# Altium footprint library Cyberdeck.PcbLib: 261 footprints (part 2 of 17)
Each footprint in its own frame and in the unit in brackets; x right, y up, seen from the top. Pads: shape width x height; smd on the part's side, far side on the other; paste and mask are expansions set on the pad; w line width, h text height; cw(c..) or ccw(c..) is an arc to the next point about the centre after c.
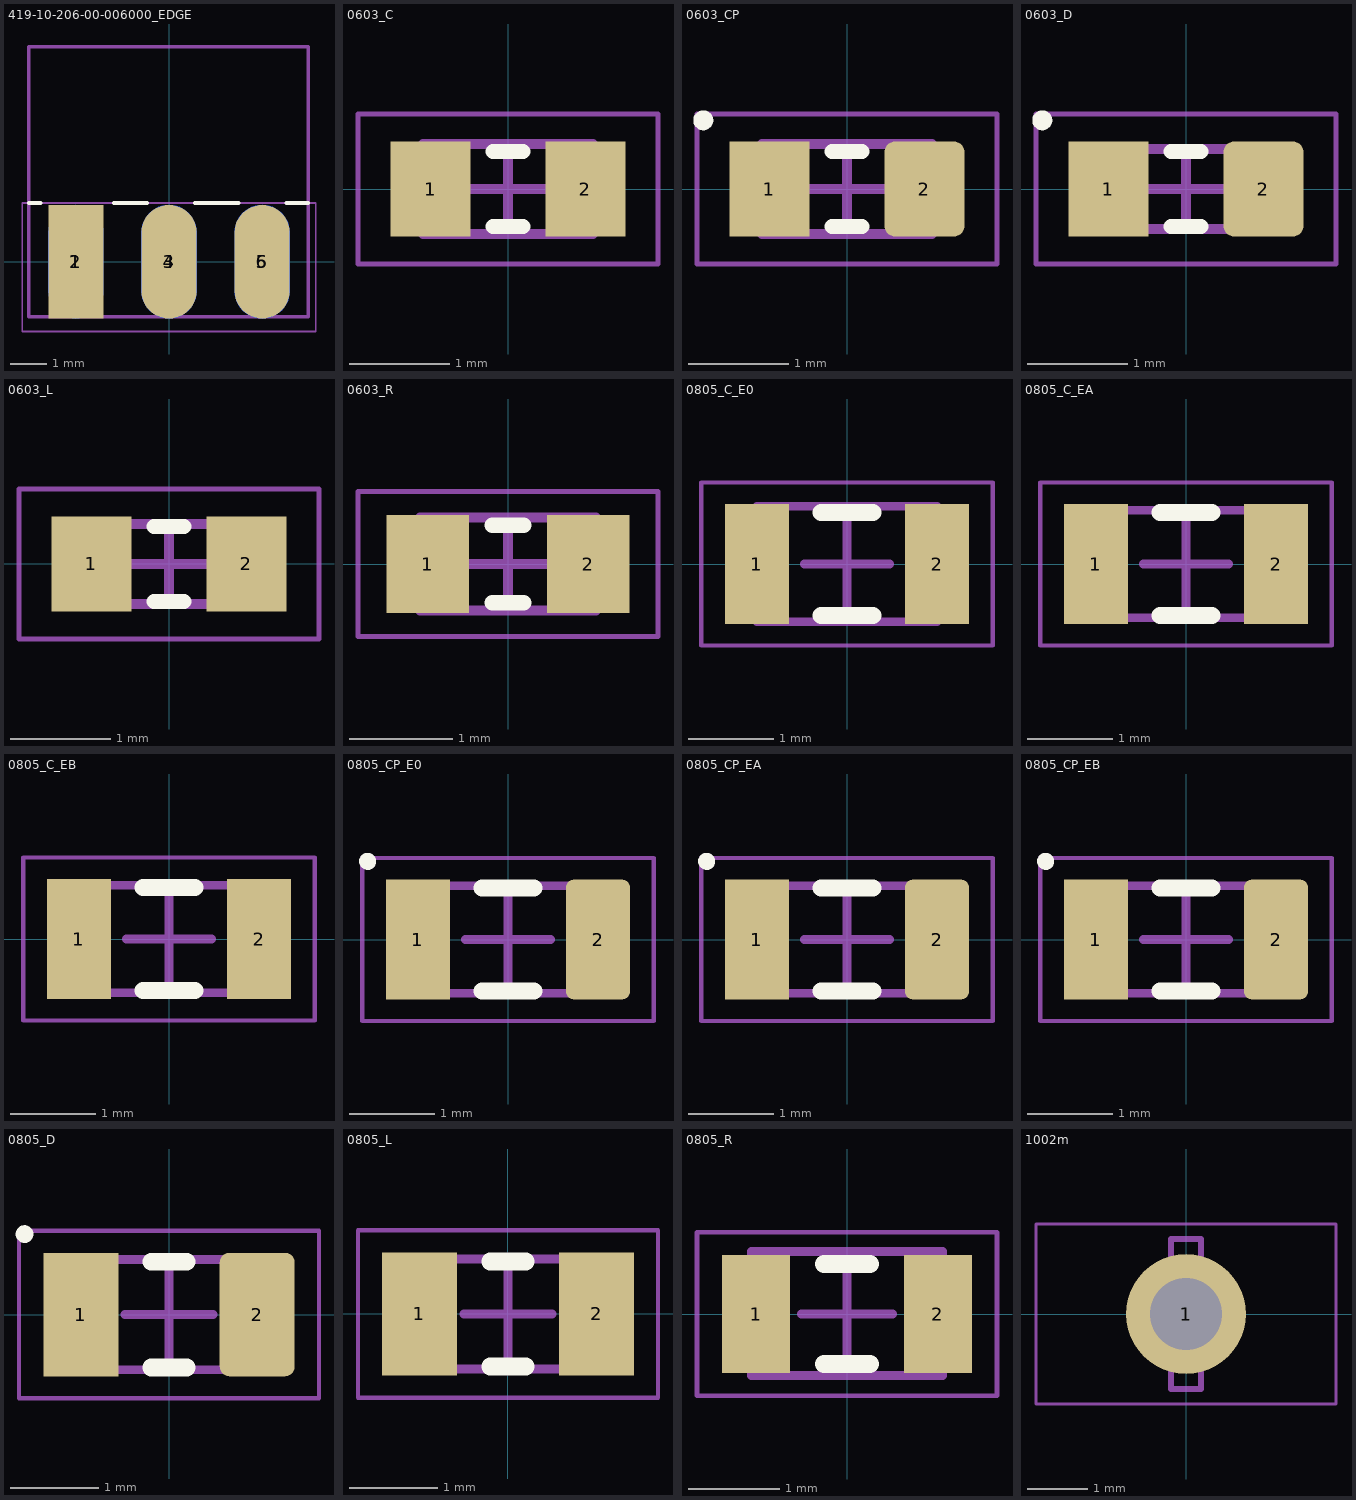
[diagram p1: the footprints below, top view; thin cyan lines are the x and y axes]

## 419-10-206-00-006000_EDGE [mm] "419-10-206-00-006000_EDGE"
height 2.6
pads (6):
  rect 1.5x3.1 smd: 1(-2.54,0)
  oval 1.5x3.1 smd far side: 2(-2.54,0) 4(0,0) 6(2.54,0)
  oval 1.5x3.1 smd: 3(0,0) 5(2.54,0)
Top Overlay:
  lines w0.1: -3.825,1.6 -3.5,1.6 ; -1.5,1.6 -0.6,1.6 ; 0.7,1.6 1.9,1.6 ; 3.2,1.6 3.8,1.6
Assembly Top:
  lines w0.1: -3.825,-1.5 -3.825,5.866 3.795,5.866 3.795,-1.5 -3.825,-1.5
Courtyard Top:
  lines w0.05: -4,-1.9 4,-1.9 4,1.6 -4,1.6 -4,-1.9
  lines w0.1: -0.5,0 0.5,0 ; 0,-0.5 0,0.5
3D body "mill-max-419-10-206-00-006000.STEP": height 1.52, standoff -3.56, extent -3.825,-1.5 3.795,5.866

## 0603_C [mm] "0603_C"
height 0.8
pads (2):
  rect 0.8x0.95 smd: 1(-0.775,0) 2(0.775,0)
Top Overlay:
  lines w0.15: -0.15,-0.375 0.15,-0.375 ; -0.15,0.375 0.15,0.375
Assembly Top:
  lines w0.1: -0.85,-0.45 -0.85,0.45 0.85,0.45 0.85,-0.45 -0.85,-0.45
Courtyard Top:
  lines w0.05: -1.5,-0.75 1.5,-0.75 1.5,0.75 -1.5,0.75 -1.5,-0.75
  lines w0.1: -0.4,0 0.4,0 ; 0,-0.4 0,0.4
3D body "CAPC-0603-T0.9-BN.stp": height 0.9, standoff 0, extent -0.85,-0.45 0.85,0.45

## 0603_CP [mm] "0603_CP"
height 0.8
pads (2):
  rect 0.8x0.95 smd: 1(-0.775,0)
  rrect25% 0.8x0.95 smd: 2(0.775,0)
Top Overlay:
  circle w0.1: c-1.437,0.687 r0.05
  lines w0.15: -0.15,-0.375 0.15,-0.375 ; -0.15,0.375 0.15,0.375
Assembly Top:
  lines w0.1: -0.85,-0.45 -0.85,0.45 0.85,0.45 0.85,-0.45 -0.85,-0.45
Courtyard Top:
  lines w0.05: -1.5,-0.75 1.5,-0.75 1.5,0.75 -1.5,0.75 -1.5,-0.75
  lines w0.1: -0.4,0 0.4,0 ; 0,-0.4 0,0.4
3D body "CAPC-0603-T0.9-BN.stp": height 0.9, standoff 0, extent -0.85,-0.45 0.85,0.45

## 0603_D [mm] "0603_D"
height 0.45
pads (2):
  rect 0.8x0.95 smd: 1(-0.775,0)
  rrect25% 0.8x0.95 smd: 2(0.775,0)
Top Overlay:
  circle w0.1: c-1.437,0.687 r0.05
  lines w0.15: -0.15,-0.375 0.15,-0.375 ; -0.15,0.375 0.15,0.375
Assembly Top:
  lines w0.1: -0.8,-0.4 -0.8,0.4 0.8,0.4 0.8,-0.4 -0.8,-0.4
Courtyard Top:
  lines w0.05: -1.5,-0.75 -1.5,0.75 1.5,0.75 1.5,-0.75 -1.5,-0.75
  lines w0.1: -0.4,0 0.4,0 ; 0,-0.4 0,0.4
3D body: height 0.45, standoff 0, extent -0.55,-0.4 0.55,0.4
3D body: height 0.45, standoff 0, extent -0.8,-0.4 -0.55,0.4
3D body: height 0.45, standoff 0, extent 0.55,-0.4 0.8,0.4

## 0603_L [mm] "0603_L"
height 0.45
pads (2):
  rect 0.8x0.95 smd: 1(-0.775,0) 2(0.775,0)
Top Overlay:
  lines w0.15: -0.15,-0.375 0.15,-0.375 ; -0.15,0.375 0.15,0.375
Assembly Top:
  lines w0.1: -0.8,-0.4 -0.8,0.4 0.8,0.4 0.8,-0.4 -0.8,-0.4
Courtyard Top:
  lines w0.05: -1.5,-0.75 -1.5,0.75 1.5,0.75 1.5,-0.75 -1.5,-0.75
  lines w0.1: -0.4,0 0.4,0 ; 0,-0.4 0,0.4
3D body: height 0.45, standoff 0, extent -0.55,-0.4 0.55,0.4
3D body: height 0.45, standoff 0, extent -0.8,-0.4 -0.55,0.4
3D body: height 0.45, standoff 0, extent 0.55,-0.4 0.8,0.4

## 0603_R [mm] "0603_R"
height 0.45
pads (2):
  rect 0.8x0.95 smd: 1(-0.775,0) 2(0.775,0)
Top Overlay:
  lines w0.15: -0.15,-0.375 0.15,-0.375 ; -0.15,0.375 0.15,0.375
Assembly Top:
  lines w0.1: -0.85,-0.45 -0.85,0.45 0.85,0.45 0.85,-0.45 -0.85,-0.45
Courtyard Top:
  lines w0.05: -1.45,-0.7 -1.45,0.7 1.45,0.7 1.45,-0.7 -1.45,-0.7
  lines w0.1: -0.4,0 0.4,0 ; 0,-0.4 0,0.4
3D body "RESC-0603.stp": height 0.55, standoff 0, extent -0.85,-0.45 0.85,0.45

## 0805_C_E0 [mm] "0805_C_E0"
height 0.6
pads (2):
  rect 0.75x1.4 smd: 1(-1.05,0) 2(1.05,0)
Top Overlay:
  lines w0.2: -0.3,-0.6 0.3,-0.6 ; -0.3,0.6 0.3,0.6
Assembly Top:
  lines w0.1: -1.05,-0.675 1.05,-0.675 1.05,0.675 -1.05,0.675 -1.05,-0.675
Courtyard Top:
  lines w0.05: -1.7,-0.95 1.7,-0.95 1.7,0.95 -1.7,0.95 -1.7,-0.95
  lines w0.1: -0.5,0 0.5,0 ; 0,-0.5 0,0.5
3D body "CAPC-0805-T1.35-BN.stp": height 1.35, standoff 0, extent -1.05,-0.675 1.05,0.675

## 0805_C_EA [mm] "0805_C_EA"
height 0.85
pads (2):
  rect 0.75x1.4 smd: 1(-1.05,0) 2(1.05,0)
Top Overlay:
  lines w0.2: -0.3,-0.6 0.3,-0.6 ; -0.3,0.6 0.3,0.6
Assembly Top:
  lines w0.1: -1,-0.625 1,-0.625 1,0.625 -1,0.625 -1,-0.625
Courtyard Top:
  lines w0.05: -1.7,-0.95 1.7,-0.95 1.7,0.95 -1.7,0.95 -1.7,-0.95
  lines w0.1: -0.5,0 0.5,0 ; 0,-0.5 0,0.5
3D body: height 0.85, standoff 0, extent -0.75,-0.625 0.75,0.625
3D body: height 0.85, standoff 0, extent -1,-0.625 -0.75,0.625
3D body: height 0.85, standoff 0, extent 0.75,-0.625 1,0.625

## 0805_C_EB [mm] "0805_C_EB"
height 1.25
pads (2):
  rect 0.75x1.4 smd: 1(-1.05,0) 2(1.05,0)
Top Overlay:
  lines w0.2: -0.3,-0.6 0.3,-0.6 ; -0.3,0.6 0.3,0.6
Assembly Top:
  lines w0.1: -1,-0.625 1,-0.625 1,0.625 -1,0.625 -1,-0.625
Courtyard Top:
  lines w0.05: -1.7,-0.95 1.7,-0.95 1.7,0.95 -1.7,0.95 -1.7,-0.95
  lines w0.1: -0.5,0 0.5,0 ; 0,-0.5 0,0.5
3D body: height 1.25, standoff 0, extent 0.75,-0.625 1,0.625
3D body: height 1.25, standoff 0, extent -1,-0.625 -0.75,0.625
3D body: height 1.25, standoff 0, extent -0.75,-0.625 0.75,0.625

## 0805_CP_E0 [mm] "0805_CP_E0"
height 0.6
pads (2):
  rect 0.75x1.4 smd: 1(-1.05,0)
  rrect25% 0.75x1.4 smd: 2(1.05,0)
Top Overlay:
  circle w0.1: c-1.637,0.912 r0.05
  lines w0.2: -0.3,-0.6 0.3,-0.6 ; -0.3,0.6 0.3,0.6
Assembly Top:
  lines w0.1: -1,-0.625 1,-0.625 1,0.625 -1,0.625 -1,-0.625
Courtyard Top:
  lines w0.05: -1.7,-0.95 1.7,-0.95 1.7,0.95 -1.7,0.95 -1.7,-0.95
  lines w0.1: -0.5,0 0.5,0 ; 0,-0.5 0,0.5
3D body: height 0.6, standoff 0, extent 0.75,-0.625 1,0.625
3D body: height 0.6, standoff 0, extent -1,-0.625 -0.75,0.625
3D body: height 0.6, standoff 0, extent -0.75,-0.625 0.75,0.625

## 0805_CP_EA [mm] "0805_CP_EA"
height 0.85
pads (2):
  rect 0.75x1.4 smd: 1(-1.05,0)
  rrect25% 0.75x1.4 smd: 2(1.05,0)
Top Overlay:
  circle w0.1: c-1.637,0.912 r0.05
  lines w0.2: -0.3,-0.6 0.3,-0.6 ; -0.3,0.6 0.3,0.6
Assembly Top:
  lines w0.1: -1,-0.625 -1,0.625 1,0.625 1,-0.625 -1,-0.625
Courtyard Top:
  lines w0.05: -1.7,-0.95 -1.7,0.95 1.7,0.95 1.7,-0.95 -1.7,-0.95
  lines w0.1: -0.5,0 0.5,0 ; 0,-0.5 0,0.5
3D body: height 0.85, standoff 0, extent -0.75,-0.625 0.75,0.625
3D body: height 0.85, standoff 0, extent -1,-0.625 -0.75,0.625
3D body: height 0.85, standoff 0, extent 0.75,-0.625 1,0.625

## 0805_CP_EB [mm] "0805_CP_EB"
height 1.25
pads (2):
  rect 0.75x1.4 smd: 1(-1.05,0)
  rrect25% 0.75x1.4 smd: 2(1.05,0)
Top Overlay:
  circle w0.1: c-1.637,0.912 r0.05
  lines w0.2: -0.3,-0.6 0.3,-0.6 ; -0.3,0.6 0.3,0.6
Assembly Top:
  lines w0.1: -1,-0.625 -1,0.625 1,0.625 1,-0.625 -1,-0.625
Courtyard Top:
  lines w0.05: -1.7,-0.95 -1.7,0.95 1.7,0.95 1.7,-0.95 -1.7,-0.95
  lines w0.1: -0.5,0 0.5,0 ; 0,-0.5 0,0.5
3D body: height 1.25, standoff 0, extent -0.75,-0.625 0.75,0.625
3D body: height 1.25, standoff 0, extent -1,-0.625 -0.75,0.625
3D body: height 1.25, standoff 0, extent 0.75,-0.625 1,0.625

## 0805_D [mm] "0805_D"
height 0.5
pads (2):
  rect 0.85x1.4 smd: 1(-1,0)
  rrect25% 0.85x1.4 smd: 2(1,0)
Top Overlay:
  circle w0.1: c-1.637,0.912 r0.05
  lines w0.2: -0.2,-0.6 0.2,-0.6 ; -0.2,0.6 0.2,0.6
Assembly Top:
  lines w0.1: -1,-0.625 -1,0.625 1,0.625 1,-0.625 -1,-0.625
Courtyard Top:
  lines w0.05: -1.7,-0.95 -1.7,0.95 1.7,0.95 1.7,-0.95 -1.7,-0.95
  lines w0.1: -0.5,0 0.5,0 ; 0,-0.5 0,0.5
3D body: height 0.5, standoff 0, extent -0.65,-0.625 0.65,0.625
3D body: height 0.5, standoff 0, extent -1,-0.625 -0.65,0.625
3D body: height 0.5, standoff 0, extent 0.65,-0.625 1,0.625

## 0805_L [mm] "0805_L"
height 0.5
pads (2):
  rect 0.85x1.39 smd: 1(-1.005,0) 2(1.005,0)
Top Overlay:
  lines w0.2: -0.2,-0.595 0.2,-0.595 ; -0.2,0.595 0.2,0.595
Assembly Top:
  lines w0.1: -1,-0.625 -1,0.625 1,0.625 1,-0.625 -1,-0.625
Courtyard Top:
  lines w0.05: -1.7,-0.95 -1.7,0.95 1.7,0.95 1.7,-0.95 -1.7,-0.95
  lines w0.1: -0.5,0 0.5,0 ; 0,-0.5 0,0.5
3D body: height 0.5, standoff 0, extent -0.65,-0.625 0.65,0.625
3D body: height 0.5, standoff 0, extent -1,-0.625 -0.65,0.625
3D body: height 0.5, standoff 0, extent 0.65,-0.625 1,0.625

## 0805_R [mm] "0805_R"
height 0.5
pads (2):
  rect 0.75x1.3 smd: 1(-1,0) 2(1,0)
Top Overlay:
  lines w0.2: -0.25,-0.55 0.25,-0.55 ; -0.25,0.55 0.25,0.55
Assembly Top:
  lines w0.1: -1.05,-0.675 -1.05,0.686 1.05,0.686 1.05,-0.675 -1.05,-0.675
Courtyard Top:
  lines w0.05: -1.65,-0.9 -1.65,0.9 1.65,0.9 1.65,-0.9 -1.65,-0.9
  lines w0.1: -0.5,0 0.5,0 ; 0,-0.5 0,0.5
3D body "RESC-0805.stp": height 0.6, standoff 0, extent -1.05,-0.675 1.05,0.675

## 1002m [mm] "Vogt 1002m"
height 5.5
pads (1):
  round 2 hole 1.2: 1(0,0)
Assembly Top:
  lines w0.1: -0.25,-1.25 0.25,-1.25 0.25,1.25 -0.25,1.25 -0.25,-1.25
Courtyard Top:
  lines w0.05: -2.5,-1.5 -2.5,1.5 2.5,1.5 2.5,-1.5 -2.5,-1.5
  lines w0.1: -0.5,0 0.5,0 0,0 0,0.5 0,-0.5
3D body "1002m.step": height 5.51, standoff -2.99, extent -0.25,-1.25 0.25,1.25